# Altium footprint library HARTING THD.PcbLib: 113 footprints (part 2 of 11) (continued)
## HARTING_09 03 196 6921 [mm] "Connector; DIN 41612, Type C, Thru-Hole; Rows a+b+c, 96 Position; Right Angle"
height 11
pads (98):
  round 1.7 hole 1: a1(0,0) a2(0,-2.54) a3(0,-5.08) a4(0,-7.62) a5(0,-10.16) a6(0,-12.7) a7(0,-15.24) a8(0,-17.78) a9(0,-20.32) a10(0,-22.86) a11(0,-25.4) a12(0,-27.94) a13(0,-30.48) a14(0,-33.02) a15(0,-35.56) a16(0,-38.1) a17(0,-40.64) a18(0,-43.18) a19(0,-45.72) a20(0,-48.26) a21(0,-50.8) a22(0,-53.34) a23(0,-55.88) a24(0,-58.42) a25(0,-60.96) a26(0,-63.5) a27(0,-66.04) a28(0,-68.58) a29(0,-71.12) a30(0,-73.66) a31(0,-76.2) a32(0,-78.74) b1(-2.54,0) b2(-2.54,-2.54) b3(-2.54,-5.08) b4(-2.54,-7.62) b5(-2.54,-10.16) b6(-2.54,-12.7) b7(-2.54,-15.24) b8(-2.54,-17.78) b9(-2.54,-20.32) b10(-2.54,-22.86) b11(-2.54,-25.4) b12(-2.54,-27.94) b13(-2.54,-30.48) b14(-2.54,-33.02) b15(-2.54,-35.56) b16(-2.54,-38.1) b17(-2.54,-40.64) b18(-2.54,-43.18) b19(-2.54,-45.72) b20(-2.54,-48.26) b21(-2.54,-50.8) b22(-2.54,-53.34) b23(-2.54,-55.88) b24(-2.54,-58.42) b25(-2.54,-60.96) b26(-2.54,-63.5) b27(-2.54,-66.04) b28(-2.54,-68.58) b29(-2.54,-71.12) b30(-2.54,-73.66) b31(-2.54,-76.2) b32(-2.54,-78.74) c1(-5.08,0) c2(-5.08,-2.54) c3(-5.08,-5.08) c4(-5.08,-7.62) c5(-5.08,-10.16) c6(-5.08,-12.7) c7(-5.08,-15.24) c8(-5.08,-17.78) c9(-5.08,-20.32) c10(-5.08,-22.86) c11(-5.08,-25.4) c12(-5.08,-27.94) c13(-5.08,-30.48) c14(-5.08,-33.02) c15(-5.08,-35.56) c16(-5.08,-38.1) c17(-5.08,-40.64) c18(-5.08,-43.18) c19(-5.08,-45.72) c20(-5.08,-48.26) c21(-5.08,-50.8) c22(-5.08,-53.34) c23(-5.08,-55.88) c24(-5.08,-58.42) c25(-5.08,-60.96) c26(-5.08,-63.5) c27(-5.08,-66.04) c28(-5.08,-68.58) c29(-5.08,-71.12) c30(-5.08,-73.66) c31(-5.08,-76.2) c32(-5.08,-78.74)
  round 3.5 / inner round 3.5 / far side round 5.1 hole 2.8: MTG1(2.54,5.08) MTG2(2.54,-83.82)
Top Overlay:
  drawing of 227 lines, arcs and shapes, not listed
  text "a" at -1.175,2.05 h1.2
  text "b" at -2.75,2.08 h1.2
  text "c" at -4.9,2.025 h1.2
  text "1" at -7.045,-0.55 h1.2
  text "32" at -8.57,-79.39 h1.2
  text "5" at -7.445,-10.86 h1.2
  text "10" at -8.495,-23.51 h1.2
  text "15" at -8.47,-36.11 h1.2
  text "20" at -8.57,-48.91 h1.2
  text "25" at -8.57,-61.61 h1.2
  text "30" at -8.57,-74.31 h1.2
Mechanical 8:
  lines w0.1: -5.08,-39.37 12.64,-39.37 ; 5.3,-86.3 5.3,7.5
  text "PCB" at 5.08,-41.275 h1.2
Mechanical 14:
  drawing of 161 lines, arcs and shapes, not listed
  text "a" at 0.635,-0.635 h1.2
  text "c" at -4.445,-0.635 h1.2
  text "1" at -7.045,-0.55 h1.2
  text "32" at -8.57,-79.39 h1.2
  text "5" at -7.445,-10.86 h1.2
  text "10" at -8.495,-23.51 h1.2
  text "15" at -8.47,-36.11 h1.2
  text "20" at -8.57,-48.91 h1.2
  text "25" at -8.57,-61.61 h1.2
  text "30" at -8.57,-74.31 h1.2
  text "c" at -4.9,2.025 h1.2
  text "b" at -2.75,2.08 h1.2
  text "a" at -1.175,2.05 h1.2
3D body "HARTING_09 03 196 6921.stp": height 9.35, standoff -3, extent -5.38,-86.37 12.64,7.63

## HARTING_09 03 224 6805 [mm] "DIN 41612, Type M, Thru-Hole; Lead 4.5mm, Pitch 2.54mm, Rows a+b+c, 24 Signal Contacts + 8 Positions for Special Contacts, Straight Female Connector, Performance level 2"
height 12.6
pads (34):
  round 1.7 hole 1: a13(-5.08,-30.48) a14(-5.08,-33.02) a15(-5.08,-35.56) a16(-5.08,-38.1) a17(-5.08,-40.64) a18(-5.08,-43.18) a19(-5.08,-45.72) a20(-5.08,-48.26) b13(-2.54,-30.48) b14(-2.54,-33.02) b15(-2.54,-35.56) b16(-2.54,-38.1) b17(-2.54,-40.64) b18(-2.54,-43.18) b19(-2.54,-45.72) b20(-2.54,-48.26) c13(0,-30.48) c14(0,-33.02) c15(0,-35.56) c16(0,-38.1) c17(0,-40.64) c18(0,-43.18) c19(0,-45.72) c20(0,-48.26)
  round 1 hole 6.1 unplated mask+2.55: MECH(-2.54,-76.2) MECH(-2.54,-68.58) MECH(-2.54,-60.96) MECH(-2.54,-53.34) MECH(-2.54,-25.4) MECH(-2.54,-17.78) MECH(-2.54,-10.16) MECH(-2.54,-2.54)
  round 3.5 / inner round 3.5 / far side round 5.1 hole 2.8: MTG1(-2.84,5.63) MTG2(-2.84,-84.37)
Top Overlay:
  lines w0.2: -7.79,-84.37 -5.815,-84.37 ; -7.79,-77.87 -6.79,-77.87 ; -7.79,-0.87 -6.79,-0.87 ; -7.79,5.63 -5.815,5.63 ; -6.14,-81.87 -6.14,-79.403 ; -6.14,-78.078 -6.14,-74.323 ; -6.14,-72.998 -6.14,-71.783 ; -6.14,-70.458 -6.14,-66.703 ; -6.14,-65.378 -6.14,-64.163 ; -6.14,-62.838 -6.14,-59.083 ; -6.14,-57.758 -6.14,-56.543 ; -6.14,-55.218 -6.14,-51.463 ; -6.14,-50.138 -6.14,-46.383 ; -6.14,-45.058 -6.14,-43.843 ; -6.14,-42.518 -6.14,-41.303 ; -6.14,-39.978 -6.14,-38.763 ; -6.14,-37.438 -6.14,-36.223 ; -6.14,-34.898 -6.14,-33.683 ; -6.14,-32.358 -6.14,-31.143 ; -6.14,-29.818 -6.14,-28.603 ; -6.14,-27.278 -6.14,-23.523 ; -6.14,-22.198 -6.14,-20.983 ; -6.14,-19.658 -6.14,-15.903 ; -6.14,-14.578 -6.14,-13.363 ; -6.14,-12.038 -6.14,-8.283 ; -6.14,-6.958 -6.14,-5.742 ; -6.14,-4.418 -6.14,-0.662 ; -6.14,0.662 -6.14,3.13 ; -6.03,-81.87 -6.03,-79.552 ; -6.03,-81.22 -2.04,-81.22 ; -6.03,-77.928 -6.03,-74.472 ; -6.03,-72.848 -6.03,-71.932 ; -6.03,-70.308 -6.03,-66.852 ; -6.03,-65.228 -6.03,-64.312 ; -6.03,-62.688 -6.03,-59.232 ; -6.03,-57.608 -6.03,-56.692 ; -6.03,-55.068 -6.03,-51.612 ; -6.03,-49.988 -6.03,-46.532 ; -6.03,-44.908 -6.03,-43.992 ; -6.03,-42.368 -6.03,-41.452 ; -6.03,-39.828 -6.03,-38.912 ; -6.03,-37.288 -6.03,-36.372 ; -6.03,-34.748 -6.03,-33.832 ; -6.03,-32.208 -6.03,-31.292 ; -6.03,-29.668 -6.03,-28.752 ; -6.03,-27.128 -6.03,-23.672 ; -6.03,-22.048 -6.03,-21.132 ; -6.03,-19.508 -6.03,-16.052 ; -6.03,-14.428 -6.03,-13.512 ; -6.03,-11.888 -6.03,-8.432 ; -6.03,-6.808 -6.03,-5.892 ; -6.03,-4.268 -6.03,-0.812 ; -6.03,0.812 -6.03,3.13 ; -6.03,2.48 -2.04,2.48 ; -5.815,-86.82 -5.815,-84.37 ; -5.815,8.08 -5.815,5.63 ; -4.372,-81.87 -5.815,-84.37 ; -4.372,3.13 -5.815,5.63 ; 0.135,-86.82 0.135,-84.37 ; 0.135,8.08 0.135,5.63 ; 0.95,-80.82 0.95,-79.552 ; 0.95,-80.17 -2.04,-80.17 ; 0.95,-77.928 0.95,-74.472 ; 0.95,-72.848 0.95,-71.932 ; 0.95,-70.308 0.95,-66.852 ; 0.95,-65.228 0.95,-64.312 ; 0.95,-62.688 0.95,-59.232 ; 0.95,-57.608 0.95,-56.692 ; 0.95,-55.068 0.95,-51.612 ; 0.95,-49.988 0.95,-46.532 ; 0.95,-44.908 0.95,-43.992 ; 0.95,-42.368 0.95,-41.452 ; 0.95,-39.828 0.95,-38.912 ; 0.95,-37.288 0.95,-36.372 ; 0.95,-34.748 0.95,-31.292 ; 0.95,-29.668 0.95,-28.752 ; 0.95,-27.128 0.95,-23.672 ; 0.95,-22.048 0.95,-21.132 ; 0.95,-19.508 0.95,-16.052 ; 0.95,-14.428 0.95,-13.512 ; 0.95,-11.888 0.95,-8.432 ; 0.95,-6.808 0.95,-5.892 ; 0.95,-4.268 0.95,-0.812 ; 0.95,0.812 0.95,2.08 ; 0.95,1.43 -2.04,1.43 ; 1.06,-80.82 1.06,-79.403 ; 1.06,-78.078 1.06,-74.323 ; 1.06,-72.998 1.06,-71.783 ; 1.06,-70.458 1.06,-66.703 ; 1.06,-65.378 1.06,-64.163 ; 1.06,-62.838 1.06,-59.083 ; 1.06,-57.758 1.06,-56.543 ; 1.06,-55.218 1.06,-51.463 ; 1.06,-50.138 1.06,-46.383 ; 1.06,-45.058 1.06,-43.843 ; 1.06,-42.518 1.06,-41.303 ; 1.06,-39.978 1.06,-38.763 ; 1.06,-37.438 1.06,-36.223 ; 1.06,-34.898 1.06,-33.683 ; 1.06,-32.358 1.06,-31.143 ; 1.06,-29.818 1.06,-28.603 ; 1.06,-27.278 1.06,-23.523 ; 1.06,-22.198 1.06,-20.983 ; 1.06,-19.658 1.06,-15.903 ; 1.06,-14.578 1.06,-13.363 ; 1.06,-12.038 1.06,-8.283 ; 1.06,-6.958 1.06,-5.742 ; 1.06,-4.418 1.06,-0.662 ; 1.06,0.662 1.06,2.08 ; 1.71,-77.87 2.71,-77.87 ; 1.71,-0.87 2.71,-0.87 ; 2.71,-84.37 0.135,-84.37 ; 2.71,5.63 0.135,5.63 ; -2.04,-81.22 -1.39,-81.87 -1.39,-80.82 ; -2.04,-81.22 -2.04,-80.17 ; -2.04,-80.17 -1.39,-80.82 ; -2.04,1.43 -2.04,2.48 ; -2.04,1.43 -1.39,2.08 ; -2.04,2.48 -1.39,3.13 -1.39,2.08 ; -1.39,-80.82 1.71,-80.82 1.71,2.08 -1.39,2.08 ; 0.135,-84.37 -1.308,-81.87 -6.79,-81.87 -6.79,3.13 -1.308,3.13 0.135,5.63 ; -7.79,-86.82 2.71,-86.82 2.71,8.08 -7.79,8.08 -7.79,-86.82
  text "30" at -10.495,-74.31 h1.2
  text "25" at -10.495,-61.61 h1.2
  text "20" at -10.495,-48.91 h1.2
  text "15" at -10.395,-36.11 h1.2
  text "10" at -10.42,-23.51 h1.2
  text "5" at -9.37,-10.86 h1.2
  text "32" at -10.495,-79.39 h1.2
  text "1" at -8.97,-0.55 h1.2
  text "c" at 1.35,3.9 h1.2
  text "a" at -6.275,4 h1.2
Mechanical 8:
  drawing of 268 lines, arcs and shapes, not listed
Mechanical 14:
  drawing of 348 lines, arcs and shapes, not listed
  text "a" at -6.275,4 h1.2
  text "c" at 1.35,3.9 h1.2
  text "30" at -10.495,-74.31 h1.2
  text "25" at -10.495,-61.61 h1.2
  text "20" at -10.495,-48.91 h1.2
  text "15" at -10.395,-36.11 h1.2
  text "10" at -10.42,-23.51 h1.2
  text "5" at -9.37,-10.86 h1.2
  text "32" at -10.495,-79.39 h1.2
  text "1" at -8.97,-0.55 h1.2
3D body "HARTING_09 03 224 6805.stp": height 12.6, standoff -4.5, extent -7.79,-86.82 2.71,8.08

## HARTING_09 03 232 6850 [mm] "DIN 41612, Type C,  Thru-Hole Press-in Terminations; Rows a+c, 32 Position, Performance level 2, Lead 4.5mm, Pitch 2.54mm, Straight Female Connector"
height 11.6
pads (34):
  round 1.7 hole 1: a2(0,-2.54) a4(0,-7.62) a6(0,-12.7) a8(0,-17.78) a10(0,-22.86) a12(0,-27.94) a14(0,-33.02) a16(0,-38.1) a18(0,-43.18) a20(0,-48.26) a22(0,-53.34) a24(0,-58.42) a26(0,-63.5) a28(0,-68.58) a30(0,-73.66) a32(0,-78.74) c2(5.08,-2.54) c4(5.08,-7.62) c6(5.08,-12.7) c8(5.08,-17.78) c10(5.08,-22.86) c12(5.08,-27.94) c14(5.08,-33.02) c16(5.08,-38.1) c18(5.08,-43.18) c20(5.08,-48.26) c22(5.08,-53.34) c24(5.08,-58.42) c26(5.08,-63.5) c28(5.08,-68.58) c30(5.08,-73.66) c32(5.08,-78.74)
  round 3.5 / inner round 3.5 / far side round 5.1 hole 2.8: MTG1(2.24,5.63) MTG2(2.24,-84.37)
Top Overlay:
  lines w0.2: -2.71,-84.37 -0.735,-84.37 ; -2.71,-77.87 -1.685,-77.87 ; -1.685,-0.87 -2.71,-0.87 -2.71,5.63 -0.735,5.63 ; -1.035,-79.4 -1.035,-81.195 ; -1.035,0.775 -1.035,2.455 ; 1,8.03 -0.735,8.03 ; 2.54,-81.845 2.54,-81.195 ; 2.54,3.105 2.54,2.455 ; 3.5,8.03 5.215,8.03 ; 3.665,-80.145 3.665,-81.845 3.015,-81.195 ; 3.665,1.405 3.665,3.105 3.015,2.455 ; 6.115,-79.425 6.115,-80.145 ; 6.115,0.825 6.115,1.405 ; 6.765,-77.87 7.79,-77.87 ; 6.765,-0.87 7.79,-0.87 ; 7.79,-84.37 5.215,-84.37 ; 7.79,5.63 5.215,5.63 ; -1.685,-81.845 -1.685,3.105 ; -1.685,-81.845 -1.035,-81.195 ; -1.685,-81.845 0,-81.845 0,-81.195 ; -1.685,3.105 0,3.105 0,2.455 ; -1.685,3.105 -1.035,2.455 ; -1.035,-81.195 0,-81.195 ; -1.035,2.455 0,2.455 ; -0.735,-86.77 -0.735,-84.37 ; -0.735,-86.77 5.215,-86.77 ; -0.735,-86.77 -1.71,-86.77 cw(c-1.71,-85.77) -2.71,-85.77 -2.71,7.03 cw(c-1.71,7.03) -1.71,8.03 -0.735,8.03 ; -0.735,-84.37 0.723,-81.845 3.757,-81.845 5.215,-84.37 ; -0.735,5.63 -0.735,8.03 ; -0.735,5.63 0.723,3.105 3.757,3.105 5.215,5.63 ; 0,-81.195 0,-80.145 2.54,-80.145 2.54,-81.195 ; 0,2.455 0,1.405 2.54,1.405 2.54,2.455 ; 2.54,-81.195 3.015,-81.195 ; 2.54,2.455 3.015,2.455 ; 3.015,-81.195 3.015,-80.145 5.08,-80.145 ; 3.015,2.455 3.015,1.405 5.08,1.405 ; 5.08,-80.145 6.115,-80.145 ; 5.08,-80.145 5.08,-80.795 6.765,-80.795 ; 5.08,1.405 5.08,2.055 6.765,2.055 ; 5.08,1.405 6.115,1.405 ; 5.215,-86.77 5.215,-84.37 ; 5.215,-86.77 6.79,-86.77 ccw(c6.79,-85.77) 7.79,-85.77 7.79,7.03 ccw(c6.79,7.03) 6.79,8.03 5.215,8.03 ; 5.215,5.63 5.215,8.03 ; 6.115,-80.145 6.765,-80.795 ; 6.115,1.405 6.765,2.055 ; 6.765,-80.795 6.765,2.055
  text "a" at -1.951,3.96 h1.2
  text "c" at 5.305,2.935 h1.2
  text "10" at -5.475,-23.46 h1.2
  text "32" at -5.675,-79.365 h1.2
  text "5" at -4.55,-10.835 h1.2
  text "30" at -5.675,-74.285 h1.2
  text "25" at -5.675,-61.585 h1.2
  text "20" at -5.675,-48.885 h1.2
  text "15" at -5.475,-36.135 h1.2
  text "1" at -4.075,-0.675 h1.2
Mechanical 8:
  lines w0.1: 1.54,-39.37 2.54,-39.37 ; 2.24,-84.37 4.78,-84.37 ; 2.24,5.63 4.78,5.63 ; 2.54,-40.37 2.54,-39.37 ; 2.54,-38.37 2.54,-39.37 ; 3.54,-39.37 2.54,-39.37
Mechanical 14:
  circle w0.1: c2.24,5.63 r1.425
  circle w0.1: c2.24,-84.37 r1.425
  lines w0.1: -2.71,-84.37 -0.735,-84.37 ; -2.71,5.63 -0.735,5.63 ; -0.735,-86.77 -0.735,-84.37 ; -0.735,8.03 -0.735,5.63 ; 3.665,-80.145 3.665,-81.845 ; 3.665,1.405 3.665,3.105 3.015,2.455 ; 3.757,3.105 5.215,5.63 ; 5.215,-86.77 5.215,-84.37 ; 5.215,8.03 5.215,5.63 ; 7.79,-84.37 5.215,-84.37 ; 7.79,5.63 5.215,5.63 ; -1.685,-81.845 -1.685,3.105 ; -1.685,-81.845 0,-81.845 0,-81.195 ; -1.685,-81.845 -1.035,-81.195 ; -1.685,3.105 0,3.105 0,2.455 ; -1.685,3.105 -1.035,2.455 ; -1.035,-81.195 0,-81.195 ; -1.035,-81.195 -1.035,2.455 ; -1.035,2.455 0,2.455 ; -0.735,-84.37 0.723,-81.845 2.54,-81.845 ; -0.735,5.63 0.723,3.105 2.54,3.105 2.54,2.455 ; 0,-81.195 0,-80.145 2.54,-80.145 2.54,-81.195 ; 0,2.455 0,1.405 2.54,1.405 2.54,2.455 ; 2.54,-81.845 3.665,-81.845 ; 2.54,-81.845 2.54,-81.195 ; 2.54,-81.195 3.015,-81.195 ; 2.54,2.455 3.015,2.455 ; 3.015,-81.195 3.665,-81.845 ; 3.015,-81.195 3.015,-80.145 5.08,-80.145 ; 3.015,2.455 3.015,1.405 5.08,1.405 ; 3.665,-81.845 3.757,-81.845 5.215,-84.37 ; 5.08,-80.145 5.08,-80.795 6.765,-80.795 ; 5.08,-80.145 6.115,-80.145 ; 5.08,1.405 5.08,2.055 6.765,2.055 ; 5.08,1.405 6.115,1.405 ; 6.115,-80.145 6.765,-80.795 ; 6.115,-80.145 6.115,1.405 ; 6.115,1.405 6.765,2.055 ; 6.765,-80.795 6.765,2.055 ; -2.71,-85.77 ccw(c-1.71,-85.77) -1.71,-86.77 6.79,-86.77 ccw(c6.79,-85.77) 7.79,-85.77 7.79,7.03 ccw(c6.79,7.03) 6.79,8.03 -1.71,8.03 ccw(c-1.71,7.03) -2.71,7.03 -2.71,-85.77
  text "a" at -1.951,3.96 h1.2
  text "c" at 5.305,2.935 h1.2
  text "10" at -5.475,-23.46 h1.2
  text "32" at -5.675,-79.365 h1.2
  text "5" at -4.55,-10.835 h1.2
  text "30" at -5.675,-74.285 h1.2
  text "25" at -5.675,-61.585 h1.2
  text "20" at -5.675,-48.885 h1.2
  text "15" at -5.475,-36.135 h1.2
  text "1" at -4.075,-0.675 h1.2
Drill Drawing:
  lines w0.1: -2.54,-58.42 -2.54,-81.28 7.62,-81.28 7.62,2.54 -2.54,2.54 -2.54,-20.32
  text "PRESS-FIT TECHNOLOGY diam. 1mm +0.1 -0" at -1.905,-56.515 h1
3D body "HARTING_09 03 232 6850.stp": height 11.6, standoff -4.5, extent -2.71,-86.82 7.79,8.08

## HARTING_09 03 264 6825 [mm] "DIN 41612, Type C, Thru-Hole; Rows a+c, 64 Position, Straight Female Connector"
height 11.6
pads (66):
  round 1.7 hole 1: a1(0,0) a2(0,-2.54) a3(0,-5.08) a4(0,-7.62) a5(0,-10.16) a6(0,-12.7) a7(0,-15.24) a8(0,-17.78) a9(0,-20.32) a10(0,-22.86) a11(0,-25.4) a12(0,-27.94) a13(0,-30.48) a14(0,-33.02) a15(0,-35.56) a16(0,-38.1) a17(0,-40.64) a18(0,-43.18) a19(0,-45.72) a20(0,-48.26) a21(0,-50.8) a22(0,-53.34) a23(0,-55.88) a24(0,-58.42) a25(0,-60.96) a26(0,-63.5) a27(0,-66.04) a28(0,-68.58) a29(0,-71.12) a30(0,-73.66) a31(0,-76.2) a32(0,-78.74) c1(5.08,0) c2(5.08,-2.54) c3(5.08,-5.08) c4(5.08,-7.62) c5(5.08,-10.16) c6(5.08,-12.7) c7(5.08,-15.24) c8(5.08,-17.78) c9(5.08,-20.32) c10(5.08,-22.86) c11(5.08,-25.4) c12(5.08,-27.94) c13(5.08,-30.48) c14(5.08,-33.02) c15(5.08,-35.56) c16(5.08,-38.1) c17(5.08,-40.64) c18(5.08,-43.18) c19(5.08,-45.72) c20(5.08,-48.26) c21(5.08,-50.8) c22(5.08,-53.34) c23(5.08,-55.88) c24(5.08,-58.42) c25(5.08,-60.96) c26(5.08,-63.5) c27(5.08,-66.04) c28(5.08,-68.58) c29(5.08,-71.12) c30(5.08,-73.66) c31(5.08,-76.2) c32(5.08,-78.74)
  round 3.5 / inner round 3.5 / far side round 5.1 hole 2.8: MTG1(2.24,5.63) MTG2(2.24,-84.37)
Top Overlay:
  lines w0.2: -2.71,-84.37 -0.735,-84.37 ; -2.71,-77.87 -1.685,-77.87 ; -1.685,-0.87 -2.71,-0.87 -2.71,5.63 -0.735,5.63 ; -1.035,-79.775 -1.035,-81.195 ; -1.035,1.035 -1.035,2.455 ; -0.736,-86.77 0.999,-86.77 ; 1,8.03 -0.735,8.03 ; 2.54,-81.845 2.54,-81.195 ; 2.54,3.105 2.54,2.455 ; 3.499,-86.77 5.214,-86.77 ; 3.5,8.03 5.215,8.03 ; 3.665,-80.145 3.665,-81.845 3.015,-81.195 ; 3.665,1.405 3.665,3.105 3.015,2.455 ; 6.115,-79.35 6.115,-80.145 ; 6.115,0.61 6.115,1.405 ; 6.765,-77.87 7.79,-77.87 ; 6.765,-0.87 7.79,-0.87 ; 7.79,-84.37 5.215,-84.37 ; 7.79,5.63 5.215,5.63 ; -1.685,-81.845 0,-81.845 0,-81.195 ; -1.685,-81.845 -1.035,-81.195 ; -1.685,-81.845 -1.685,3.105 ; -1.685,3.105 -1.035,2.455 ; -1.685,3.105 0,3.105 0,2.455 ; -1.035,-81.195 0,-81.195 ; -1.035,2.455 0,2.455 ; -0.735,-84.37 -0.735,-86.77 -1.71,-86.77 cw(c-1.71,-85.77) -2.71,-85.77 -2.71,7.03 cw(c-1.71,7.03) -1.71,8.03 -0.735,8.03 ; -0.735,-84.37 0.723,-81.845 3.757,-81.845 5.215,-84.37 ; -0.735,5.63 0.723,3.105 3.757,3.105 5.215,5.63 ; -0.735,5.63 -0.735,8.03 ; 0,-81.195 0,-80.145 2.54,-80.145 2.54,-81.195 ; 0,2.455 0,1.405 2.54,1.405 2.54,2.455 ; 2.54,-81.195 3.015,-81.195 ; 2.54,2.455 3.015,2.455 ; 3.015,-81.195 3.015,-80.145 5.08,-80.145 ; 3.015,2.455 3.015,1.405 5.08,1.405 ; 5.08,-80.145 5.08,-80.795 6.765,-80.795 ; 5.08,-80.145 6.115,-80.145 ; 5.08,1.405 6.115,1.405 ; 5.08,1.405 5.08,2.055 6.765,2.055 ; 5.215,-84.37 5.215,-86.77 6.79,-86.77 ccw(c6.79,-85.77) 7.79,-85.77 7.79,7.03 ccw(c6.79,7.03) 6.79,8.03 5.215,8.03 ; 5.215,5.63 5.215,8.03 ; 6.115,-80.145 6.765,-80.795 ; 6.115,1.405 6.765,2.055 ; 6.765,-80.795 6.765,2.055
  text "1" at -4.075,-0.675 h1.2
  text "15" at -5.475,-36.135 h1.2
  text "20" at -5.675,-48.885 h1.2
  text "25" at -5.675,-61.585 h1.2
  text "30" at -5.675,-74.285 h1.2
  text "5" at -4.55,-10.835 h1.2
  text "32" at -5.675,-79.365 h1.2
  text "10" at -5.475,-23.46 h1.2
  text "c" at 5.305,2.935 h1.2
  text "a" at -1.951,3.96 h1.2
Mechanical 8:
  lines w0.1: 1.54,-39.37 2.54,-39.37 ; 2.24,-84.37 4.78,-84.37 ; 2.24,5.63 4.78,5.63 ; 2.54,-40.37 2.54,-39.37 ; 2.54,-38.37 2.54,-39.37 ; 3.54,-39.37 2.54,-39.37
Mechanical 14:
  circle w0.1: c2.24,-84.37 r1.425
  circle w0.1: c2.24,5.63 r1.425
  lines w0.1: -2.71,-84.37 -0.735,-84.37 ; -2.71,5.63 -0.735,5.63 ; -0.735,-86.77 -0.735,-84.37 ; -0.735,8.03 -0.735,5.63 ; 3.665,-80.145 3.665,-81.845 ; 3.665,1.405 3.665,3.105 3.015,2.455 ; 3.757,3.105 5.215,5.63 ; 5.215,-86.77 5.215,-84.37 ; 5.215,8.03 5.215,5.63 ; 7.79,-84.37 5.215,-84.37 ; 7.79,5.63 5.215,5.63 ; -1.685,-81.845 -1.035,-81.195 ; -1.685,-81.845 0,-81.845 0,-81.195 ; -1.685,-81.845 -1.685,3.105 ; -1.685,3.105 -1.035,2.455 ; -1.685,3.105 0,3.105 0,2.455 ; -1.035,-81.195 -1.035,2.455 ; -1.035,-81.195 0,-81.195 ; -1.035,2.455 0,2.455 ; -0.735,-84.37 0.723,-81.845 2.54,-81.845 ; -0.735,5.63 0.723,3.105 2.54,3.105 2.54,2.455 ; 0,-81.195 0,-80.145 2.54,-80.145 2.54,-81.195 ; 0,2.455 0,1.405 2.54,1.405 2.54,2.455 ; 2.54,-81.845 2.54,-81.195 ; 2.54,-81.845 3.665,-81.845 ; 2.54,-81.195 3.015,-81.195 ; 2.54,2.455 3.015,2.455 ; 3.015,-81.195 3.015,-80.145 5.08,-80.145 ; 3.015,-81.195 3.665,-81.845 ; 3.015,2.455 3.015,1.405 5.08,1.405 ; 3.665,-81.845 3.757,-81.845 5.215,-84.37 ; 5.08,-80.145 6.115,-80.145 ; 5.08,-80.145 5.08,-80.795 6.765,-80.795 ; 5.08,1.405 6.115,1.405 ; 5.08,1.405 5.08,2.055 6.765,2.055 ; 6.115,-80.145 6.115,1.405 ; 6.115,-80.145 6.765,-80.795 ; 6.115,1.405 6.765,2.055 ; 6.765,-80.795 6.765,2.055 ; -2.71,-85.77 ccw(c-1.71,-85.77) -1.71,-86.77 6.79,-86.77 ccw(c6.79,-85.77) 7.79,-85.77 7.79,7.03 ccw(c6.79,7.03) 6.79,8.03 -1.71,8.03 ccw(c-1.71,7.03) -2.71,7.03 -2.71,-85.77
  text "1" at -4.075,-0.675 h1.2
  text "15" at -5.475,-36.135 h1.2
  text "20" at -5.675,-48.885 h1.2
  text "25" at -5.675,-61.585 h1.2
  text "30" at -5.675,-74.285 h1.2
  text "5" at -4.55,-10.835 h1.2
  text "32" at -5.675,-79.365 h1.2
  text "10" at -5.475,-23.46 h1.2
  text "c" at 5.305,2.935 h1.2
  text "a" at -1.951,3.96 h1.2
3D body "HARTING_09 03 264 6825.stp": height 11.6, standoff -4.5, extent -2.71,-86.82 7.79,8.08

## HARTING_09 03 264 6850 [mm] "DIN 41612, Type C,  Thru-Hole Press-in Terminations; Rows a+c, 64 Position, Straight Female Connector , Performance level 2, Lead 4.5 mm"
height 11.6
pads (66):
  round 1.7 hole 1: a1(0,0) a2(0,-2.54) a3(0,-5.08) a4(0,-7.62) a5(0,-10.16) a6(0,-12.7) a7(0,-15.24) a8(0,-17.78) a9(0,-20.32) a10(0,-22.86) a11(0,-25.4) a12(0,-27.94) a13(0,-30.48) a14(0,-33.02) a15(0,-35.56) a16(0,-38.1) a17(0,-40.64) a18(0,-43.18) a19(0,-45.72) a20(0,-48.26) a21(0,-50.8) a22(0,-53.34) a23(0,-55.88) a24(0,-58.42) a25(0,-60.96) a26(0,-63.5) a27(0,-66.04) a28(0,-68.58) a29(0,-71.12) a30(0,-73.66) a31(0,-76.2) a32(0,-78.74) c1(5.08,0) c2(5.08,-2.54) c3(5.08,-5.08) c4(5.08,-7.62) c5(5.08,-10.16) c6(5.08,-12.7) c7(5.08,-15.24) c8(5.08,-17.78) c9(5.08,-20.32) c10(5.08,-22.86) c11(5.08,-25.4) c12(5.08,-27.94) c13(5.08,-30.48) c14(5.08,-33.02) c15(5.08,-35.56) c16(5.08,-38.1) c17(5.08,-40.64) c18(5.08,-43.18) c19(5.08,-45.72) c20(5.08,-48.26) c21(5.08,-50.8) c22(5.08,-53.34) c23(5.08,-55.88) c24(5.08,-58.42) c25(5.08,-60.96) c26(5.08,-63.5) c27(5.08,-66.04) c28(5.08,-68.58) c29(5.08,-71.12) c30(5.08,-73.66) c31(5.08,-76.2) c32(5.08,-78.74)
  round 3.5 / inner round 3.5 / far side round 5.1 hole 2.8: MTG1(2.24,5.63) MTG2(2.24,-84.37)
Top Overlay:
  lines w0.2: -2.71,-84.37 -0.735,-84.37 ; -2.71,-77.87 -1.685,-77.87 ; -1.685,-0.87 -2.71,-0.87 -2.71,5.63 -0.735,5.63 ; -1.035,-79.775 -1.035,-81.195 ; -1.035,1.035 -1.035,2.455 ; -0.736,-86.77 0.999,-86.77 ; 1,8.03 -0.735,8.03 ; 2.54,-81.845 2.54,-81.195 ; 2.54,3.105 2.54,2.455 ; 3.499,-86.77 5.214,-86.77 ; 3.5,8.03 5.215,8.03 ; 3.665,-80.145 3.665,-81.845 3.015,-81.195 ; 3.665,1.405 3.665,3.105 3.015,2.455 ; 6.115,-79.35 6.115,-80.145 ; 6.115,0.61 6.115,1.405 ; 6.765,-77.87 7.79,-77.87 ; 6.765,-0.87 7.79,-0.87 ; 7.79,-84.37 5.215,-84.37 ; 7.79,5.63 5.215,5.63 ; -1.685,-81.845 -1.685,3.105 ; -1.685,-81.845 -1.035,-81.195 ; -1.685,-81.845 0,-81.845 0,-81.195 ; -1.685,3.105 0,3.105 0,2.455 ; -1.685,3.105 -1.035,2.455 ; -1.035,-81.195 0,-81.195 ; -1.035,2.455 0,2.455 ; -0.735,-84.37 0.723,-81.845 3.757,-81.845 5.215,-84.37 ; -0.735,-84.37 -0.735,-86.77 -1.71,-86.77 cw(c-1.71,-85.77) -2.71,-85.77 -2.71,7.03 cw(c-1.71,7.03) -1.71,8.03 -0.735,8.03 ; -0.735,5.63 -0.735,8.03 ; -0.735,5.63 0.723,3.105 3.757,3.105 5.215,5.63 ; 0,-81.195 0,-80.145 2.54,-80.145 2.54,-81.195 ; 0,2.455 0,1.405 2.54,1.405 2.54,2.455 ; 2.54,-81.195 3.015,-81.195 ; 2.54,2.455 3.015,2.455 ; 3.015,-81.195 3.015,-80.145 5.08,-80.145 ; 3.015,2.455 3.015,1.405 5.08,1.405 ; 5.08,-80.145 6.115,-80.145 ; 5.08,-80.145 5.08,-80.795 6.765,-80.795 ; 5.08,1.405 5.08,2.055 6.765,2.055 ; 5.08,1.405 6.115,1.405 ; 5.215,-84.37 5.215,-86.77 6.79,-86.77 ccw(c6.79,-85.77) 7.79,-85.77 7.79,7.03 ccw(c6.79,7.03) 6.79,8.03 5.215,8.03 ; 5.215,5.63 5.215,8.03 ; 6.115,-80.145 6.765,-80.795 ; 6.115,1.405 6.765,2.055 ; 6.765,-80.795 6.765,2.055
  text "a" at -1.951,3.96 h1.2
  text "c" at 5.305,2.935 h1.2
  text "10" at -5.475,-23.46 h1.2
  text "32" at -5.675,-79.365 h1.2
  text "5" at -4.55,-10.835 h1.2
  text "30" at -5.675,-74.285 h1.2
  text "25" at -5.675,-61.585 h1.2
  text "20" at -5.675,-48.885 h1.2
  text "15" at -5.475,-36.135 h1.2
  text "1" at -4.075,-0.675 h1.2
Mechanical 8:
  lines w0.1: 1.54,-39.37 2.54,-39.37 ; 2.24,-84.37 4.78,-84.37 ; 2.24,5.63 4.78,5.63 ; 2.54,-40.37 2.54,-39.37 ; 2.54,-38.37 2.54,-39.37 ; 3.54,-39.37 2.54,-39.37
Mechanical 14:
  circle w0.1: c2.24,5.63 r1.425
  circle w0.1: c2.24,-84.37 r1.425
  lines w0.1: -2.71,-84.37 -0.735,-84.37 ; -2.71,5.63 -0.735,5.63 ; -0.735,-86.77 -0.735,-84.37 ; -0.735,8.03 -0.735,5.63 ; 3.665,-80.145 3.665,-81.845 ; 3.665,1.405 3.665,3.105 3.015,2.455 ; 3.757,3.105 5.215,5.63 ; 5.215,-86.77 5.215,-84.37 ; 5.215,8.03 5.215,5.63 ; 7.79,-84.37 5.215,-84.37 ; 7.79,5.63 5.215,5.63 ; -1.685,-81.845 -1.685,3.105 ; -1.685,-81.845 0,-81.845 0,-81.195 ; -1.685,-81.845 -1.035,-81.195 ; -1.685,3.105 0,3.105 0,2.455 ; -1.685,3.105 -1.035,2.455 ; -1.035,-81.195 0,-81.195 ; -1.035,-81.195 -1.035,2.455 ; -1.035,2.455 0,2.455 ; -0.735,-84.37 0.723,-81.845 2.54,-81.845 ; -0.735,5.63 0.723,3.105 2.54,3.105 2.54,2.455 ; 0,-81.195 0,-80.145 2.54,-80.145 2.54,-81.195 ; 0,2.455 0,1.405 2.54,1.405 2.54,2.455 ; 2.54,-81.845 3.665,-81.845 ; 2.54,-81.845 2.54,-81.195 ; 2.54,-81.195 3.015,-81.195 ; 2.54,2.455 3.015,2.455 ; 3.015,-81.195 3.665,-81.845 ; 3.015,-81.195 3.015,-80.145 5.08,-80.145 ; 3.015,2.455 3.015,1.405 5.08,1.405 ; 3.665,-81.845 3.757,-81.845 5.215,-84.37 ; 5.08,-80.145 5.08,-80.795 6.765,-80.795 ; 5.08,-80.145 6.115,-80.145 ; 5.08,1.405 5.08,2.055 6.765,2.055 ; 5.08,1.405 6.115,1.405 ; 6.115,-80.145 6.765,-80.795 ; 6.115,-80.145 6.115,1.405 ; 6.115,1.405 6.765,2.055 ; 6.765,-80.795 6.765,2.055 ; -2.71,-85.77 ccw(c-1.71,-85.77) -1.71,-86.77 6.79,-86.77 ccw(c6.79,-85.77) 7.79,-85.77 7.79,7.03 ccw(c6.79,7.03) 6.79,8.03 -1.71,8.03 ccw(c-1.71,7.03) -2.71,7.03 -2.71,-85.77
  text "a" at -1.951,3.96 h1.2
  text "c" at 5.305,2.935 h1.2
  text "10" at -5.475,-23.46 h1.2
  text "32" at -5.675,-79.365 h1.2
  text "5" at -4.55,-10.835 h1.2
  text "30" at -5.675,-74.285 h1.2
  text "25" at -5.675,-61.585 h1.2
  text "20" at -5.675,-48.885 h1.2
  text "15" at -5.475,-36.135 h1.2
  text "1" at -4.075,-0.675 h1.2
Drill Drawing:
  lines w0.1: -2.54,-58.42 -2.54,-81.28 7.62,-81.28 7.62,2.54 -2.54,2.54 -2.54,-20.32
  text "PRESS-FIT TECHNOLOGY diam. 1mm +0.1 -0" at -1.905,-56.515 h1
3D body "HARTING_09 03 264 6850.stp": height 11.6, standoff -4.5, extent -2.71,-86.82 7.79,8.08